# Altium footprint library 自建库.PcbLib: 169 footprints (part 10 of 11)
Each footprint in its own frame and in the unit in brackets; x right, y up, seen from the top. Pads: shape width x height; smd on the part's side, far side on the other; paste and mask are expansions set on the pad; w line width, h text height; cw(c..) or ccw(c..) is an arc to the next point about the centre after c.
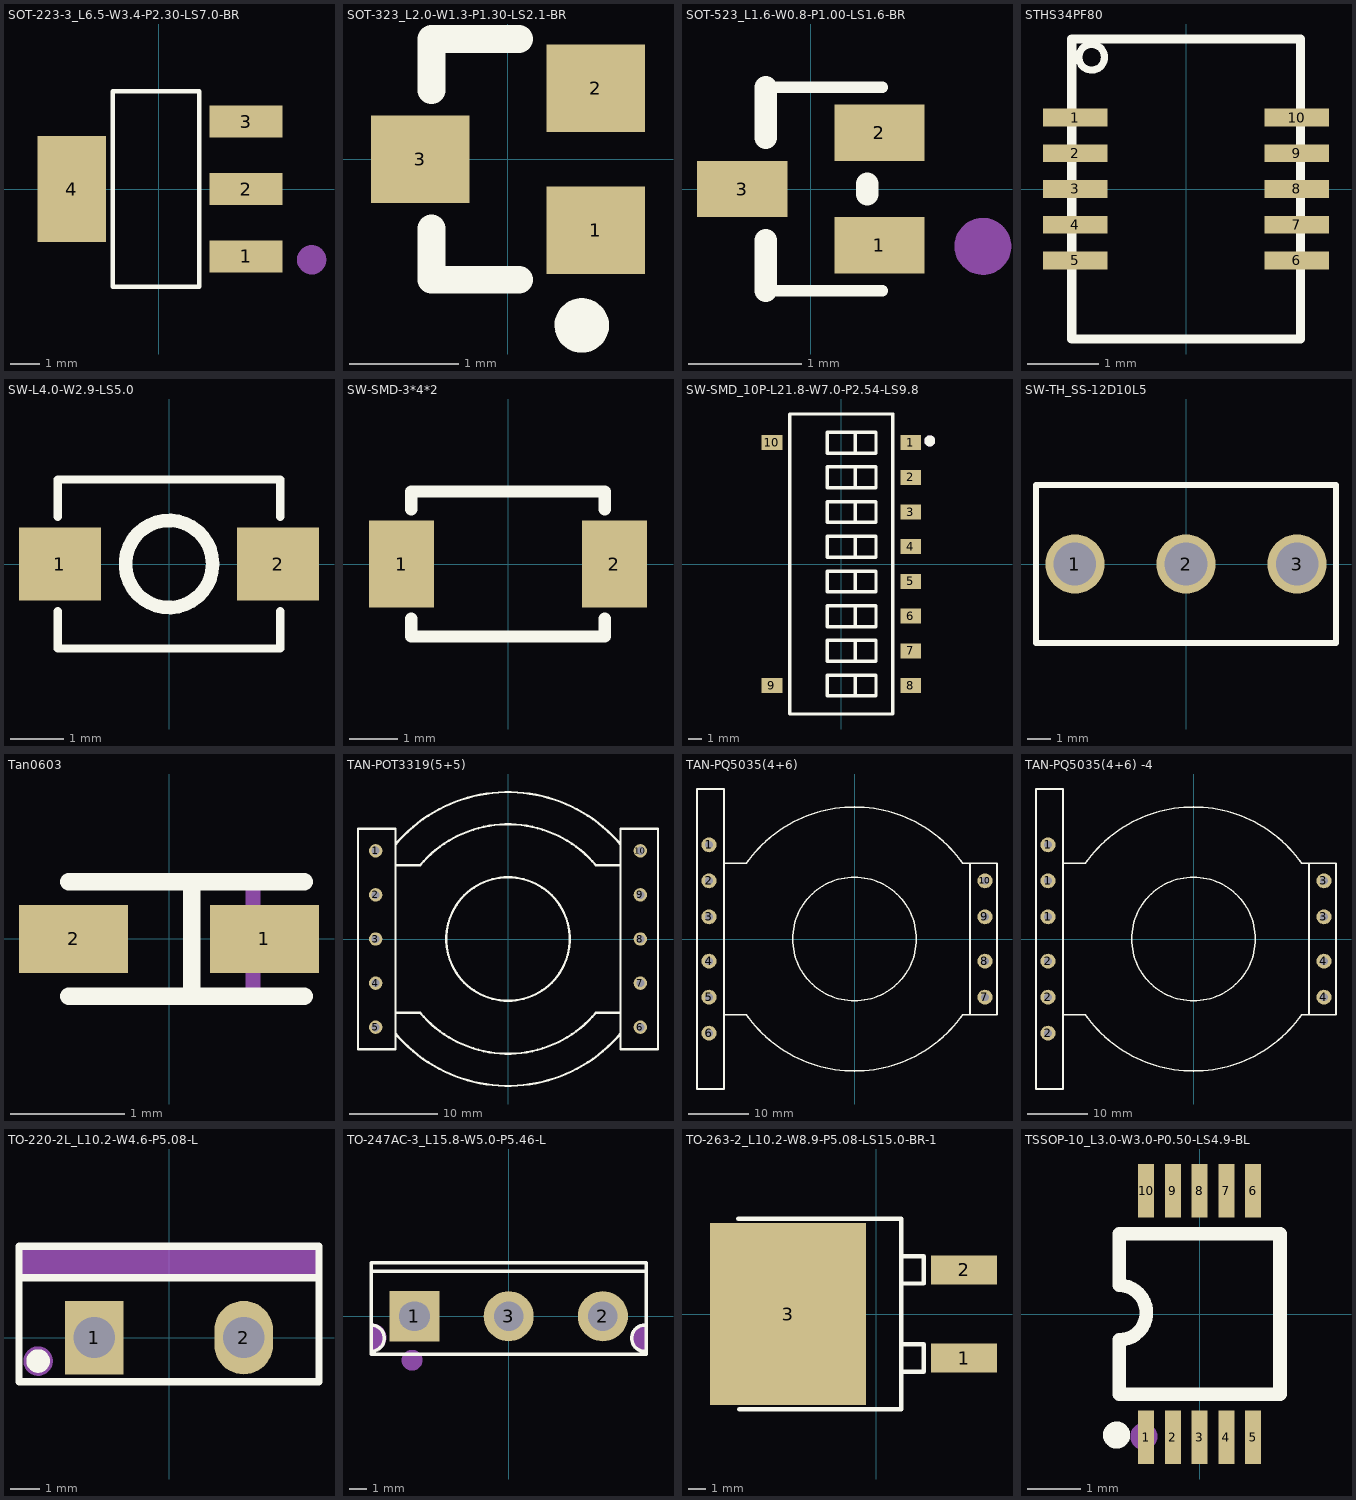
[diagram p9: the footprints below, top view; thin cyan lines are the x and y axes]

## SOT-223-3_L6.5-W3.4-P2.30-LS7.0-BR [mm]
pads (4):
  rect 2.5x1.1 smd: 1(2.97,-2.3) 2(2.97,0) 3(2.97,2.3)
  rect 2.34x3.6 smd: 4(-2.97,0)
Top Overlay:
  lines w0.152: -1.571,-3.326 -1.571,3.326 1.371,3.326 1.371,-3.326 -1.571,-3.326
Mechanical 15:
  circle w0.5: c5.207,-2.413 r0.25
3D body "SOT223.STEP": height 1.65, standoff 0, extent -3.5,-3.25 3.5,3.25

## SOT-323_L2.0-W1.3-P1.30-LS2.1-BR [mm]
pads (3):
  rect 0.9x0.8 smd: 1(0.8,-0.65) 2(0.8,0.65) 3(-0.8,0)
Top Overlay:
  lines w0.249: 0.673,-1.393 ccw(c0.674,-1.517) 0.676,-1.393
  lines w0.254: -0.7,-0.631 -0.7,-1.1 0.1,-1.1 ; -0.7,0.631 -0.7,1.1 0.1,1.1
Mechanical 15:
  circle w0.254: c1,-0.6 r0.127
3D body "SOT-323.stp": height 0.9, standoff -0.05, extent -1.05,-1 1.05,1

## SOT-523_L1.6-W0.8-P1.00-LS1.6-BR [mm]
pads (3):
  rect 0.8x0.5 smd: 1(0.608,-0.5) 2(0.608,0.5) 3(-0.608,0)
Top Overlay:
  lines w0.1: -0.4,-0.9 0.635,-0.9 ; -0.4,0.9 0.635,0.9
  lines w0.2: -0.4,-0.9 -0.4,-0.454 ; -0.4,0.454 -0.4,0.9 ; 0.5,-0.046 0.5,0.046 ; 0.5,-0.019 0.5,0.019
Mechanical 15:
  circle w0.254: c1.524,-0.508 r0.125
3D body "SOT-523.STEP": height 0.8, standoff 0, extent -0.8,-0.8 0.8,0.8

## STHS34PF80 [mm] "人体传感器"
pads (10):
  rect 0.9x0.25 smd: 1(-1.55,1) 2(-1.55,0.5) 3(-1.55,0) 4(-1.55,-0.5) 5(-1.55,-1) 6(1.55,-1) 7(1.55,-0.5) 8(1.55,0) 9(1.55,0.5) 10(1.55,1)
Top Overlay:
  circle w0.1: c-1.321,1.844 r0.18
  lines w0.127: -1.6,-2.1 1.6,-2.1 1.6,2.1 -1.6,2.1 -1.6,-2.1
3D body "STHS34.stp": height 1.46, standoff 0, extent -1.6,-2.1 1.6,2.1

## SW-L4.0-W2.9-LS5.0 [mm]
pads (2):
  rect 1.53x1.36 smd: 1(-2.035,0) 2(2.035,0)
Top Overlay:
  circle w0.254: c0,0 r0.813
  lines w0.152: -2.076,-0.883 -2.076,-1.576 2.076,-1.576 2.076,-0.883 ; -2.076,0.883 -2.076,1.576 2.076,1.576 2.076,0.883
3D body "sw4.stp": height 2.51, standoff 0, extent -2.5,-1.45 2.5,1.45

## SW-SMD-3*4*2 [mm]
height 20
pads (2):
  rect 1.35x1.8 smd: 1(-2.2,0) 2(2.2,0)
Top Overlay:
  lines w0.254: -2,-1.131 -2,-1.5 2,-1.5 2,-1.131 ; -2,1.131 -2,1.5 2,1.5 2,1.131
3D body "sw3.stp": height 1.98, standoff -0.5, extent -2.5,-1.505 2.5,1.495

## SW-SMD_10P-L21.8-W7.0-P2.54-LS9.8 [mm]
pads (10):
  rect 1.524x1.1 smd paste+0 mask+0.051: 1(5.08,8.89) 2(5.08,6.35) 3(5.08,3.81) 4(5.08,1.27) 5(5.08,-1.27) 6(5.08,-3.81) 7(5.08,-6.35) 8(5.08,-8.89) 9(-5.08,-8.89) 10(-5.08,8.89)
Top Overlay:
  circle w0.4: c6.477,9.017 r0.2
  lines w0.254: -3.78,10.969 -3.657,10.986 3.764,10.986 3.782,10.968 3.782,-10.974 -3.762,-10.974 -3.762,10.971 ; 1.016,-9.652 1.016,-8.128 ; 1.016,-7.112 1.016,-5.588 ; 1.016,-4.572 1.016,-3.048 ; 1.016,-2.032 1.016,-0.508 ; 1.016,0.508 1.016,2.032 ; 1.016,3.048 1.016,4.572 ; 1.016,5.588 1.016,7.112 ; 1.016,8.128 1.016,9.652 ; -1.016,-9.652 -1.016,-8.128 2.54,-8.128 2.54,-9.652 -1.016,-9.652 ; -1.016,-7.112 -1.016,-5.588 2.54,-5.588 2.54,-7.112 -1.016,-7.112 ; -1.016,-4.572 -1.016,-3.048 2.54,-3.048 2.54,-4.572 -1.016,-4.572 ; -1.016,-2.032 -1.016,-0.508 2.54,-0.508 2.54,-2.032 -1.016,-2.032 ; -1.016,0.508 -1.016,2.032 2.54,2.032 2.54,0.508 -1.016,0.508 ; -1.016,3.048 -1.016,4.572 2.54,4.572 2.54,3.048 -1.016,3.048 ; -1.016,5.588 -1.016,7.112 2.54,7.112 2.54,5.588 -1.016,5.588 ; -1.016,8.128 -1.016,9.652 2.54,9.652 2.54,8.128 -1.016,8.128
Mechanical 15:
  circle w0.4: c6.477,9.017 r0.2
3D body "sw8.stp": height 4.25, standoff 0, extent -4.9,-9.63 4.9,12.17

## SW-TH_SS-12D10L5 [mm] "滑动开关"
pads (3):
  round 2.5 hole 1.8: 1(-4.7,0) 2(0,0) 3(4.7,0)
Top Overlay:
  lines w0.254: -6.35,-3.35 6.35,-3.35 6.35,3.35 -6.35,3.35 -6.35,-3.35
3D body "1.stp": height 10.1, standoff -7, extent -6.5,-3.4 6.5,3.4

## Tan0603 [mm] "C962635-1608"
pads (2):
  rect 0.954x0.594 smd: 1(0.835,0) 2(-0.835,0)
Top Overlay:
  lines w0.152: -0.876,-0.501 1.181,-0.501 ; -0.876,0.501 1.181,0.501 ; 0.2,-0.502 0.2,0.5
Mechanical 15:
  region: -0.736,-0.032 -0.736,0.032 -0.481,0.032 -0.481,-0.032
  region: 0.736,-0.032 0.736,0.032 0.481,0.032 0.481,-0.032
  region: 0.641,-0.212 0.641,0.212 0.577,0.212 0.577,-0.212
  region: 0.8,-0.425 0.8,-0.212 0.672,-0.212 0.672,-0.425
  region: 0.8,0.425 0.8,0.212 0.672,0.212 0.672,0.425
3D body "CAP0603-2.STEP": height 0.8, standoff 0, extent -0.8,-0.4 0.8,0.4

## TAN-POT3319(5+5) [mil]
pads (10):
  round 60 hole 36 paste+0 mask+2: 1(-590.55,393.7) 2(-590.55,196.85) 3(-590.55,0) 4(-590.55,-196.85) 5(-590.55,-393.7) 6(590.55,-393.7) 7(590.55,-196.85) 8(590.55,0) 9(590.55,196.85) 10(590.55,393.7)
Top Overlay:
  circle w10: c0,0 r275.59
  lines w10: -502.15,-421.35 ccw(c0,0) 502.15,-421.35 ; -502.15,421.35 cw(c0,0) 502.15,421.35 ; -501.97,-328.99 -392.07,-328.99 ccw(c0,0) 392.07,-328.99 501.97,-328.99 ; -501.97,328.99 -392.07,328.99 cw(c0,0) 392.07,328.99 501.97,328.99 ; -669.29,-492.13 -501.97,-492.13 -501.97,492.13 -669.29,492.13 -669.29,-492.13 ; 501.97,-492.13 669.29,-492.13 669.29,492.13 501.97,492.13 501.97,-492.13

## TAN-PQ5035(4+6) [mm]
pads (10):
  round 2.5 hole 1.3 paste+0 mask+0.051: 1(-24.25,15.7) 2(-24.25,9.7) 3(-24.25,3.7) 4(-24.25,-3.7) 5(-24.25,-9.7) 6(-24.25,-15.7) 7(21.75,-9.7) 8(21.75,-3.7) 9(21.75,3.7) 10(21.75,9.7)
Top Overlay:
  circle w0.254: c0,0 r10.3
  lines w0.254: -21.75,-12.619 -18.021,-12.619 ccw(c0,0) 18.021,-12.619 19.25,-12.619 ; -21.75,12.619 -18.021,12.619 cw(c0,0) 18.021,12.619 19.25,12.619 ; 19.25,-12.619 19.25,12.619 ; 19.25,-12.619 23.75,-12.619 23.75,12.619 19.25,12.619 ; -26.25,-25 -21.75,-25 -21.75,25 -26.25,25 -26.25,-25

## TAN-PQ5035(4+6) -4 [mm] "2KW,29:4"
pads (10):
  round 2.5 hole 1.3 paste+0 mask+0.051: 1(-24.25,3.7) 1(-24.25,9.7) 1(-24.25,15.7) 2(-24.25,-15.7) 2(-24.25,-9.7) 2(-24.25,-3.7) 3(21.75,3.7) 3(21.75,9.7) 4(21.75,-9.7) 4(21.75,-3.7)
Top Overlay:
  circle w0.254: c0,0 r10.3
  lines w0.254: -21.75,-12.619 -18.021,-12.619 ccw(c0,0) 18.021,-12.619 19.25,-12.619 ; -21.75,12.619 -18.021,12.619 cw(c0,0) 18.021,12.619 19.25,12.619 ; 19.25,-12.619 23.75,-12.619 23.75,12.619 19.25,12.619 ; 19.25,-12.619 19.25,12.619 ; -26.25,-25 -26.25,25 -21.75,25 -21.75,-25 -26.25,-25

## TO-220-2L_L10.2-W4.6-P5.08-L [mm]
pads (2):
  rect 2x2.5 hole 1.4 paste+0 mask+0.051: 1(-2.54,0)
  oval 2x2.5 hole 1.4 paste+0 mask+0.051: 2(2.54,0)
Top Overlay:
  lines w0.254: -5.08,2.032 5.1,2.032 ; -5.1,-1.5 5.1,-1.5 5.1,3.1 -5.1,3.1 -5.1,-1.5
  lines w0.4: -4.451,-0.6 ccw(c-4.45,-0.8) -4.449,-0.6
Mechanical 15:
  circle w0.5: c-4.45,-0.8 r0.25
  region: -5.08,2.032 -5.08,3.048 5.08,3.048 5.08,2.032
3D body "to220.stp": height 16.51, standoff -14.73, extent -5.335,-1.575 5.335,3.235

## TO-247AC-3_L15.8-W5.0-P5.46-L [mm]
pads (3):
  rect 2.9x2.9 hole 1.7 slot 1.785 at 0 deg paste+0 mask+0.051: 1(-5.45,0)
  round 2.9 hole 1.7 paste+0 mask+0.051: 2(5.45,0) 3(-0.001,0)
Top Overlay:
  lines w0.2: -7.951,-2.029 ccw(c-7.951,-1.267) -7.951,-0.505 ; -7.951,2.6 7.949,2.6 ; 7.873,-2.032 cw(c7.873,-1.27) 7.873,-0.508 ; -7.951,-2.201 -7.951,3.1 7.949,3.1 7.949,-2.201 -7.951,-2.201
Mechanical 15:
  circle w0.6: c-5.589,-2.54 r0.3
  region: -7.875,-2.032 -7.769,-2.032 -7.566,-1.977 -7.383,-1.872 -7.234,-1.723 -7.129,-1.541 -7.075,-1.337 -7.075,-1.127 -7.129,-0.923 -7.234,-0.741 -7.383,-0.592 -7.566,-0.487 -7.769,-0.432 -7.875,-0.432
  region: 7.872,-0.432 7.767,-0.432 7.563,-0.486 7.381,-0.592 7.232,-0.741 7.127,-0.923 7.072,-1.127 7.072,-1.337 7.127,-1.541 7.232,-1.723 7.381,-1.872 7.563,-1.977 7.767,-2.032 7.872,-2.032
3D body "to247.stp": height 24.5, standoff -3.5, extent -7.901,-2.201 7.899,2.8

## TO-263-2_L10.2-W8.9-P5.08-LS15.0-BR-1 [mm]
pads (3):
  rect 3.8x1.68 smd paste+0 mask+0.051: 1(5.073,-2.54) 2(5.073,2.54)
  rect 9x10.5 smd paste+0 mask+0.051: 3(-5.073,0)
Top Overlay:
  lines w0.254: -7.936,5.49 1.444,5.49 1.444,-5.49 -7.876,-5.49 ; 1.444,-3.32 2.744,-3.32 2.744,-1.755 1.444,-1.755 ; 1.444,1.76 2.744,1.76 2.744,3.325 1.444,3.325
Mechanical 15:
  circle w0.8: c4.305,-2.54 r0.4
3D body "to263.stp": height 4.65, standoff 0, extent -8.8,-5.1 6.2,5.1

## TSSOP-10_L3.0-W3.0-P0.50-LS4.9-BL [mm]
pads (10):
  rect 0.3x1 smd: 1(-1,-2.3) 2(-0.5,-2.3) 3(0,-2.3) 4(0.5,-2.3) 5(1,-2.3) 6(1,2.3) 7(0.5,2.3) 8(0,2.3) 9(-0.5,2.3) 10(-1,2.3)
Top Overlay:
  circle w0.254: c-1.549,-2.261 r0.127
  lines w0.254: -1.501,-0.483 ccw(c-1.501,0.025) -1.5,0.533 -1.5,1.5 1.5,1.5 1.5,-1.5 -1.5,-1.5 -1.5,-0.483
Mechanical 15:
  circle w0.254: c-1.041,-2.286 r0.127
3D body "TSSOP-10.STEP": height 1.1, standoff 0, extent -1.5,-2.5 1.5,2.5